# Altium footprint library RL1.PCBLIB: 94 footprints (part 1 of 6)
Each footprint in its own frame and in the unit in brackets; x right, y up, seen from the top. Pads: shape width x height; smd on the part's side, far side on the other; paste and mask are expansions set on the pad; w line width, h text height; cw(c..) or ccw(c..) is an arc to the next point about the centre after c.
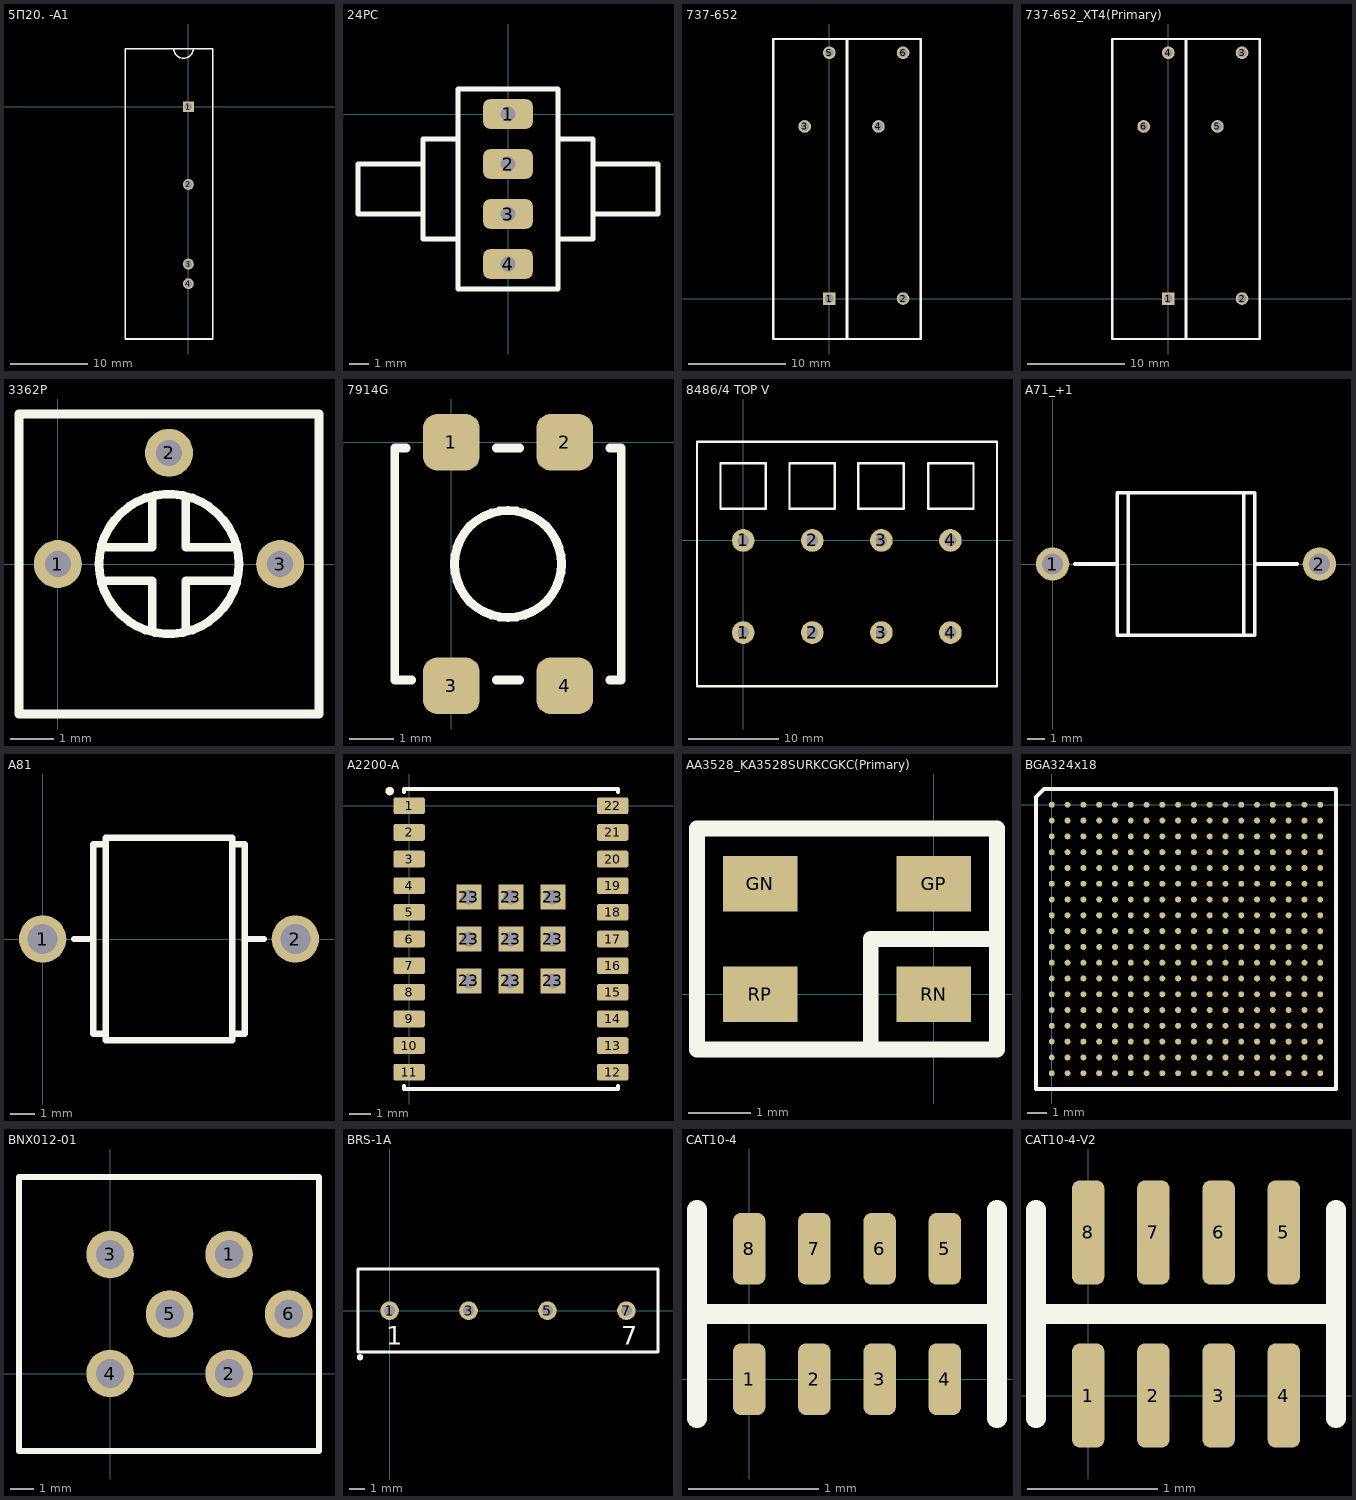
[diagram p0: the footprints below, top view; thin cyan lines are the x and y axes]

## 5П20. -А1 [mm]
pads (4):
  rect 1.4x1.4 hole 1: 1(0,0)
  round 1.4 hole 1: 2(0,-10.033) 3(0,-20.32) 4(0,-22.86)
Top Overlay:
  lines w0.2: -1.875,7.5 ccw(c-0.625,7.5) -0.625,6.25 ccw(c-0.625,7.5) 0.625,7.5 ; -8.125,-30 -8.125,7.5 3.125,7.5 3.125,-30 -8.125,-30
Top Assembly:
  text ".Designator" at 2.498,-11.583 h1

## 24PC [mil]
pads (4):
  rrect50% 100x60 hole 30: 1(0,0) 2(0,-100) 3(0,-200) 4(0,-300)
Top Overlay:
  lines w10: -170,-200 -300,-200 -300,-100 -170,-100 ; -100,-250 -170,-250 -170,-50 -100,-50 ; 100,-250 170,-250 170,-50 100,-50 ; 170,-200 300,-200 300,-100 170,-100 ; -100,-350 100,-350 100,50 -100,50 -100,-350
Top Assembly:
  text ".Designator" at 196.79,-163.12 h39.37

## 737-652 [mm]
pads (6):
  rect 1.3x1.3 hole 0.9: 1(0,0)
  round 1.3 hole 0.9: 2(7.62,0) 3(-2.54,17.78) 4(5.08,17.78) 5(0,25.4) 6(7.62,25.4)
Top Overlay:
  lines w0.254: -5.78,-4.18 1.84,-4.18 1.84,26.82 -5.78,26.82 -5.78,-4.18 ; 1.82,-4.18 9.44,-4.18 9.44,26.82 1.82,26.82 1.82,-4.18
Top Assembly:
  text ".Designator" at 6.828,10.987 h1

## 737-652_XT4(Primary) [mm]
pads (6):
  rect 1.3x1.3 hole 0.9: 1(0,0)
  round 1.3 hole 0.9: 2(7.62,0) 3(7.62,25.4) 4(0,25.4) 5(5.08,17.78) 6(-2.54,17.78)
Top Overlay:
  lines w0.254: -5.78,-4.18 1.84,-4.18 1.84,26.82 -5.78,26.82 -5.78,-4.18 ; 1.82,-4.18 9.44,-4.18 9.44,26.82 1.82,26.82 1.82,-4.18
Top Assembly:
  text ".Designator" at 6.828,10.987 h1

## 3362P [mm]
pads (3):
  round 1.1 hole 0.6: 1(0,0) 2(2.54,2.54) 3(5.08,0)
Top Overlay:
  circle w0.2: c2.54,0 r1.6
  lines w0.2: 1.016,-0.381 2.159,-0.381 2.159,-1.524 ; 1.016,0.381 2.159,0.381 2.159,1.524 ; 2.921,-1.524 2.921,-0.381 4.064,-0.381 ; 2.921,1.524 2.921,0.381 4.064,0.381 ; -0.889,-3.429 5.969,-3.429 5.969,3.429 -0.889,3.429 -0.889,-3.429
Top Assembly:
  text ".Designator" at 7.538,-0.333 h1
3D body "SW3dPS-3362P-1-102LF.STEP": height 4.59, standoff -2.8, extent -0.76,-3.298 5.84,3.302

## 7914G [mil]
pads (4):
  rrect50% 50x50 smd: 1(0,0) 2(100,0) 3(0,-215) 4(100,-215)
Top Overlay:
  circle w7.87: c50,-107.5 r47.24
  lines w7.87: -40,-5 -50,-5 -50,-210 -35,-210 ; 40,-210 60,-210 ; 40,-5 60,-5 ; 140,-210 150,-210 150,-5 140,-5
Top Assembly:
  text ".Designator" at 246.79,-120.62 h39.37

## 8486/4 TOP V [mm] "27.703.0453.0"
pads (8):
  round 2.5 hole 1.3: 1(0,-10.16) 1(0,0) 2(7.62,-10.16) 2(7.62,0) 3(15.24,-10.16) 3(15.24,0) 4(22.86,-10.16) 4(22.86,0)
Top Overlay:
  lines w0.254: -5.1,-16.1 -5.1,10.9 28,10.9 28,-16.1 -5.1,-16.1 ; -2.5,3.5 -2.5,8.5 2.5,8.5 2.5,3.5 -2.5,3.5 ; 5.1,3.5 10.1,3.5 10.1,8.5 5.1,8.5 5.1,3.5 ; 12.7,3.5 17.7,3.5 17.7,8.5 12.7,8.5 12.7,3.5 ; 20.4,3.5 25.4,3.5 25.4,8.5 20.4,8.5 20.4,3.5
Top Assembly:
  text ".Designator" at 16.448,-2.933 h1

## A71_+1 [mm]
pads (2):
  round 1.9 hole 1.2: 1(0,0) 2(15.24,0)
Top Overlay:
  lines w0.2: 1.27,0 3.683,0 ; 4.318,-4.064 4.318,4.064 ; 10.922,-4.064 10.922,4.064 ; 11.557,0 13.97,0 ; 3.683,-4.064 3.683,4.064 11.557,4.064 11.557,-4.064 3.683,-4.064
Top Assembly:
  text ".Designator" at 12.618,-0.333 h1

## A81 [mm]
pads (2):
  round 1.9 hole 1.2: 1(0,0) 2(10.16,0)
Top Overlay:
  lines w0.254: 1.27,0 2.032,0 ; 2.54,-3.81 2.032,-3.81 2.032,3.81 2.54,3.81 ; 7.62,-3.81 8.128,-3.81 8.128,3.81 7.62,3.81 ; 8.128,0 8.89,0 ; 2.54,-4.064 2.54,4.064 7.62,4.064 7.62,-4.064 2.54,-4.064
Top Assembly:
  text ".Designator" at 10.078,-0.333 h1

## A2200-A [mm]
pads (31):
  rrect25% 1.5x0.8 smd: 1(0,0) 2(0,-1.27) 3(0,-2.54) 4(0,-3.81) 5(0,-5.08) 6(0,-6.35) 7(0,-7.62) 8(0,-8.89) 9(0,-10.16) 10(0,-11.43) 11(0,-12.7) 12(9.7,-12.7) 13(9.7,-11.43) 14(9.7,-10.16) 15(9.7,-8.89) 16(9.7,-7.62) 17(9.7,-6.35) 18(9.7,-5.08) 19(9.7,-3.81) 20(9.7,-2.54) 21(9.7,-1.27) 22(9.7,0)
  rect 1.2x1.2 hole 0.7: 23(2.85,-8.35) 23(2.85,-6.35) 23(2.85,-4.35) 23(4.85,-8.35) 23(4.85,-6.35) 23(4.85,-4.35) 23(6.85,-8.35) 23(6.85,-6.35) 23(6.85,-4.35)
Top Overlay:
  circle w0.2: c-0.925,0.7 r0.1
  lines w0.2: -0.25,-13.35 -0.25,-13.5 9.95,-13.5 9.95,-13.35 ; -0.25,0.65 -0.25,0.8 9.95,0.8 9.95,0.65
Top Assembly:
  text ".Designator" at 9.712,-6.683 h1

## AA3528_KA3528SURKCGKC(Primary) [mm]
pads (4):
  rect 1.2x0.9 smd: GN(-2.794,1.778) GP(0,1.778) RN(0,0) RP(-2.794,0)
Top Overlay:
  lines w0.254: -1.016,-0.889 -1.016,0.889 1.016,0.889 ; -3.81,-0.889 -3.81,2.667 1.016,2.667 1.016,-0.889 -3.81,-0.889
Top Assembly:
  text ".Designator" at 3.601,0.556 h1

## BGA324x18 [mm]
pads (324):
  round 0.3 smd: A1(0,0) A2(0.8,0) A3(1.6,0) A4(2.4,0) A5(3.2,0) A6(4,0) A7(4.8,0) A8(5.6,0) A9(6.4,0) A10(7.2,0) A11(8,0) A12(8.8,0) A13(9.6,0) A14(10.4,0) A15(11.2,0) A16(12,0) A17(12.8,0) A18(13.6,0) B1(0,-0.8) B2(0.8,-0.8) B3(1.6,-0.8) B4(2.4,-0.8) B5(3.2,-0.8) B6(4,-0.8) B7(4.8,-0.8) B8(5.6,-0.8) B9(6.4,-0.8) B10(7.2,-0.8) B11(8,-0.8) B12(8.8,-0.8) B13(9.6,-0.8) B14(10.4,-0.8) B15(11.2,-0.8) B16(12,-0.8) B17(12.8,-0.8) B18(13.6,-0.8) C1(0,-1.6) C2(0.8,-1.6) C3(1.6,-1.6) C4(2.4,-1.6) C5(3.2,-1.6) C6(4,-1.6) C7(4.8,-1.6) C8(5.6,-1.6) C9(6.4,-1.6) C10(7.2,-1.6) C11(8,-1.6) C12(8.8,-1.6) C13(9.6,-1.6) C14(10.4,-1.6) C15(11.2,-1.6) C16(12,-1.6) C17(12.8,-1.6) C18(13.6,-1.6) D1(0,-2.4) D2(0.8,-2.4) D3(1.6,-2.4) D4(2.4,-2.4) D5(3.2,-2.4) D6(4,-2.4) D7(4.8,-2.4) D8(5.6,-2.4) D9(6.4,-2.4) D10(7.2,-2.4) D11(8,-2.4) D12(8.8,-2.4) D13(9.6,-2.4) D14(10.4,-2.4) D15(11.2,-2.4) D16(12,-2.4) D17(12.8,-2.4) D18(13.6,-2.4) E1(0,-3.2) E2(0.8,-3.2) E3(1.6,-3.2) E4(2.4,-3.2) E5(3.2,-3.2) E6(4,-3.2) E7(4.8,-3.2) E8(5.6,-3.2) E9(6.4,-3.2) E10(7.2,-3.2) E11(8,-3.2) E12(8.8,-3.2) E13(9.6,-3.2) E14(10.4,-3.2) E15(11.2,-3.2) E16(12,-3.2) E17(12.8,-3.2) E18(13.6,-3.2) F1(0,-4) F2(0.8,-4) F3(1.6,-4) F4(2.4,-4) F5(3.2,-4) F6(4,-4) F7(4.8,-4) F8(5.6,-4) F9(6.4,-4) F10(7.2,-4) F11(8,-4) F12(8.8,-4) F13(9.6,-4) F14(10.4,-4) F15(11.2,-4) F16(12,-4) F17(12.8,-4) F18(13.6,-4) G1(0,-4.8) G2(0.8,-4.8) G3(1.6,-4.8) G4(2.4,-4.8) G5(3.2,-4.8) G6(4,-4.8) G7(4.8,-4.8) G8(5.6,-4.8) G9(6.4,-4.8) G10(7.2,-4.8) G11(8,-4.8) G12(8.8,-4.8) G13(9.6,-4.8) G14(10.4,-4.8) G15(11.2,-4.8) G16(12,-4.8) G17(12.8,-4.8) G18(13.6,-4.8) H1(0,-5.6) H2(0.8,-5.6) H3(1.6,-5.6) H4(2.4,-5.6) H5(3.2,-5.6) H6(4,-5.6) H7(4.8,-5.6) H8(5.6,-5.6) H9(6.4,-5.6) H10(7.2,-5.6) H11(8,-5.6) H12(8.8,-5.6) H13(9.6,-5.6) H14(10.4,-5.6) H15(11.2,-5.6) H16(12,-5.6) H17(12.8,-5.6) H18(13.6,-5.6) J1(0,-6.4) J2(0.8,-6.4) J3(1.6,-6.4) J4(2.4,-6.4) J5(3.2,-6.4) J6(4,-6.4) J7(4.8,-6.4) J8(5.6,-6.4) J9(6.4,-6.4) J10(7.2,-6.4) J11(8,-6.4) J12(8.8,-6.4) J13(9.6,-6.4) J14(10.4,-6.4) J15(11.2,-6.4) J16(12,-6.4) J17(12.8,-6.4) J18(13.6,-6.4) K1(0,-7.2) K2(0.8,-7.2) K3(1.6,-7.2) K4(2.4,-7.2) K5(3.2,-7.2) K6(4,-7.2) K7(4.8,-7.2) K8(5.6,-7.2) K9(6.4,-7.2) K10(7.2,-7.2) K11(8,-7.2) K12(8.8,-7.2) K13(9.6,-7.2) K14(10.4,-7.2) K15(11.2,-7.2) K16(12,-7.2) K17(12.8,-7.2) K18(13.6,-7.2) L1(0,-8) L2(0.8,-8) L3(1.6,-8) L4(2.4,-8) L5(3.2,-8) L6(4,-8) L7(4.8,-8) L8(5.6,-8) L9(6.4,-8) L10(7.2,-8) L11(8,-8) L12(8.8,-8) L13(9.6,-8) L14(10.4,-8) L15(11.2,-8) L16(12,-8) L17(12.8,-8) L18(13.6,-8) M1(0,-8.8) M2(0.8,-8.8) M3(1.6,-8.8) M4(2.4,-8.8) M5(3.2,-8.8) M6(4,-8.8) M7(4.8,-8.8) M8(5.6,-8.8) M9(6.4,-8.8) M10(7.2,-8.8) M11(8,-8.8) M12(8.8,-8.8) M13(9.6,-8.8) M14(10.4,-8.8) M15(11.2,-8.8) M16(12,-8.8) M17(12.8,-8.8) M18(13.6,-8.8) N1(0,-9.6) N2(0.8,-9.6) N3(1.6,-9.6) N4(2.4,-9.6) N5(3.2,-9.6) N6(4,-9.6) N7(4.8,-9.6) N8(5.6,-9.6) N9(6.4,-9.6) N10(7.2,-9.6) N11(8,-9.6) N12(8.8,-9.6) N13(9.6,-9.6) N14(10.4,-9.6) N15(11.2,-9.6) N16(12,-9.6) N17(12.8,-9.6) N18(13.6,-9.6) P1(0,-10.4) P2(0.8,-10.4) P3(1.6,-10.4) P4(2.4,-10.4) P5(3.2,-10.4) P6(4,-10.4) P7(4.8,-10.4) P8(5.6,-10.4) P9(6.4,-10.4) P10(7.2,-10.4) P11(8,-10.4) P12(8.8,-10.4) P13(9.6,-10.4) P14(10.4,-10.4) P15(11.2,-10.4) P16(12,-10.4) P17(12.8,-10.4) P18(13.6,-10.4) R1(0,-11.2) R2(0.8,-11.2) R3(1.6,-11.2) R4(2.4,-11.2) R5(3.2,-11.2) R6(4,-11.2) R7(4.8,-11.2) R8(5.6,-11.2) R9(6.4,-11.2) R10(7.2,-11.2) R11(8,-11.2) R12(8.8,-11.2) R13(9.6,-11.2) R14(10.4,-11.2) R15(11.2,-11.2) R16(12,-11.2) R17(12.8,-11.2) R18(13.6,-11.2) T1(0,-12) T2(0.8,-12) T3(1.6,-12) T4(2.4,-12) T5(3.2,-12) T6(4,-12) T7(4.8,-12) T8(5.6,-12) T9(6.4,-12) T10(7.2,-12) T11(8,-12) T12(8.8,-12) T13(9.6,-12) T14(10.4,-12) T15(11.2,-12) T16(12,-12) T17(12.8,-12) T18(13.6,-12) U1(0,-12.8) U2(0.8,-12.8) U3(1.6,-12.8) U4(2.4,-12.8) U5(3.2,-12.8) U6(4,-12.8) U7(4.8,-12.8) U8(5.6,-12.8) U9(6.4,-12.8) U10(7.2,-12.8) U11(8,-12.8) U12(8.8,-12.8) U13(9.6,-12.8) U14(10.4,-12.8) U15(11.2,-12.8) U16(12,-12.8) U17(12.8,-12.8) U18(13.6,-12.8) V1(0,-13.6) V2(0.8,-13.6) V3(1.6,-13.6) V4(2.4,-13.6) V5(3.2,-13.6) V6(4,-13.6) V7(4.8,-13.6) V8(5.6,-13.6) V9(6.4,-13.6) V10(7.2,-13.6) V11(8,-13.6) V12(8.8,-13.6) V13(9.6,-13.6) V14(10.4,-13.6) V15(11.2,-13.6) V16(12,-13.6) V17(12.8,-13.6) V18(13.6,-13.6)
Top Overlay:
  lines w0.2: -0.8,-14.4 -0.8,0.4 -0.4,0.8 14.4,0.8 14.4,-14.4 -0.8,-14.4
Top Assembly:
  text ".Designator" at 11.798,-7.133 h1

## BNX012-01 [mm]
pads (6):
  round 2 hole 1.2: 1(5,5) 2(5,0) 3(0,5) 4(0,0) 5(2.5,2.5) 6(7.5,2.5)
Top Overlay:
  lines w0.254: -3.825,-3.25 -3.825,8.25 8.775,8.25 8.775,-3.25 -3.825,-3.25
Top Assembly:
  text ".Designator" at 7.473,2.167 h1
3D body "User Library-BNX012-01.STEP": height 8, standoff -4, extent -3.675,-3 8.325,8

## BRS-1A [mm]
pads (4):
  round 1.2 hole 0.7: 1(0,0) 3(5.08,0) 5(10.16,0) 7(15.24,0)
Top Overlay:
  circle w0.2: c-1.9,-3 r0.1
  lines w0.2: -2.032,-2.667 -2.032,2.667 17.272,2.667 17.272,-2.667 -2.032,-2.667
  text "1" at -0.2,-2.2 h1.2
  text "7" at 14.9,-2.2 h1.2
Top Assembly:
  text ".Designator" at 12.618,-0.55 h1
3D body "User Library-BRS.STEP": height 7.8, standoff -1.4, extent -1.9,-2.555 17.15,2.555

## CAT10-4 [mm]
pads (8):
  rrect50% 0.25x0.55 smd: 1(0,0) 2(0.5,0) 3(1,0) 4(1.5,0) 5(1.5,1) 6(1,1) 7(0.5,1) 8(0,1)
Top Overlay:
  lines w0.15: -0.4,-0.3 -0.4,1.3 ; -0.4,0.5 1.9,0.5 ; 1.9,-0.3 1.9,1.3
Top Assembly:
  text ".Designator" at -3.199,1.833 h0.8
3D body "YC124.STEP": height 0.36, standoff 0, extent -0.25,0 1.75,1

## CAT10-4-V2 [mm]
pads (8):
  rrect50% 0.25x0.8 smd: 1(0,0) 2(0.5,0) 3(1,0) 4(1.5,0) 5(1.5,1.25) 6(1,1.25) 7(0.5,1.25) 8(0,1.25)
Top Overlay:
  lines w0.15: -0.4,-0.175 -0.4,1.425 ; -0.4,0.625 1.9,0.625 ; 1.9,-0.175 1.9,1.425
Top Assembly:
  text ".Designator" at -3.199,1.958 h0.8
3D body "YC124.STEP": height 0.36, standoff 0, extent -0.25,0.125 1.75,1.125